# Altium footprint library 3.22-杂项.PcbLib: 985 footprints (part 43 of 64)
Each footprint in its own frame and in the unit in brackets; x right, y up, seen from the top. Pads: shape width x height; smd on the part's side, far side on the other; paste and mask are expansions set on the pad; w line width, h text height; cw(c..) or ccw(c..) is an arc to the next point about the centre after c.
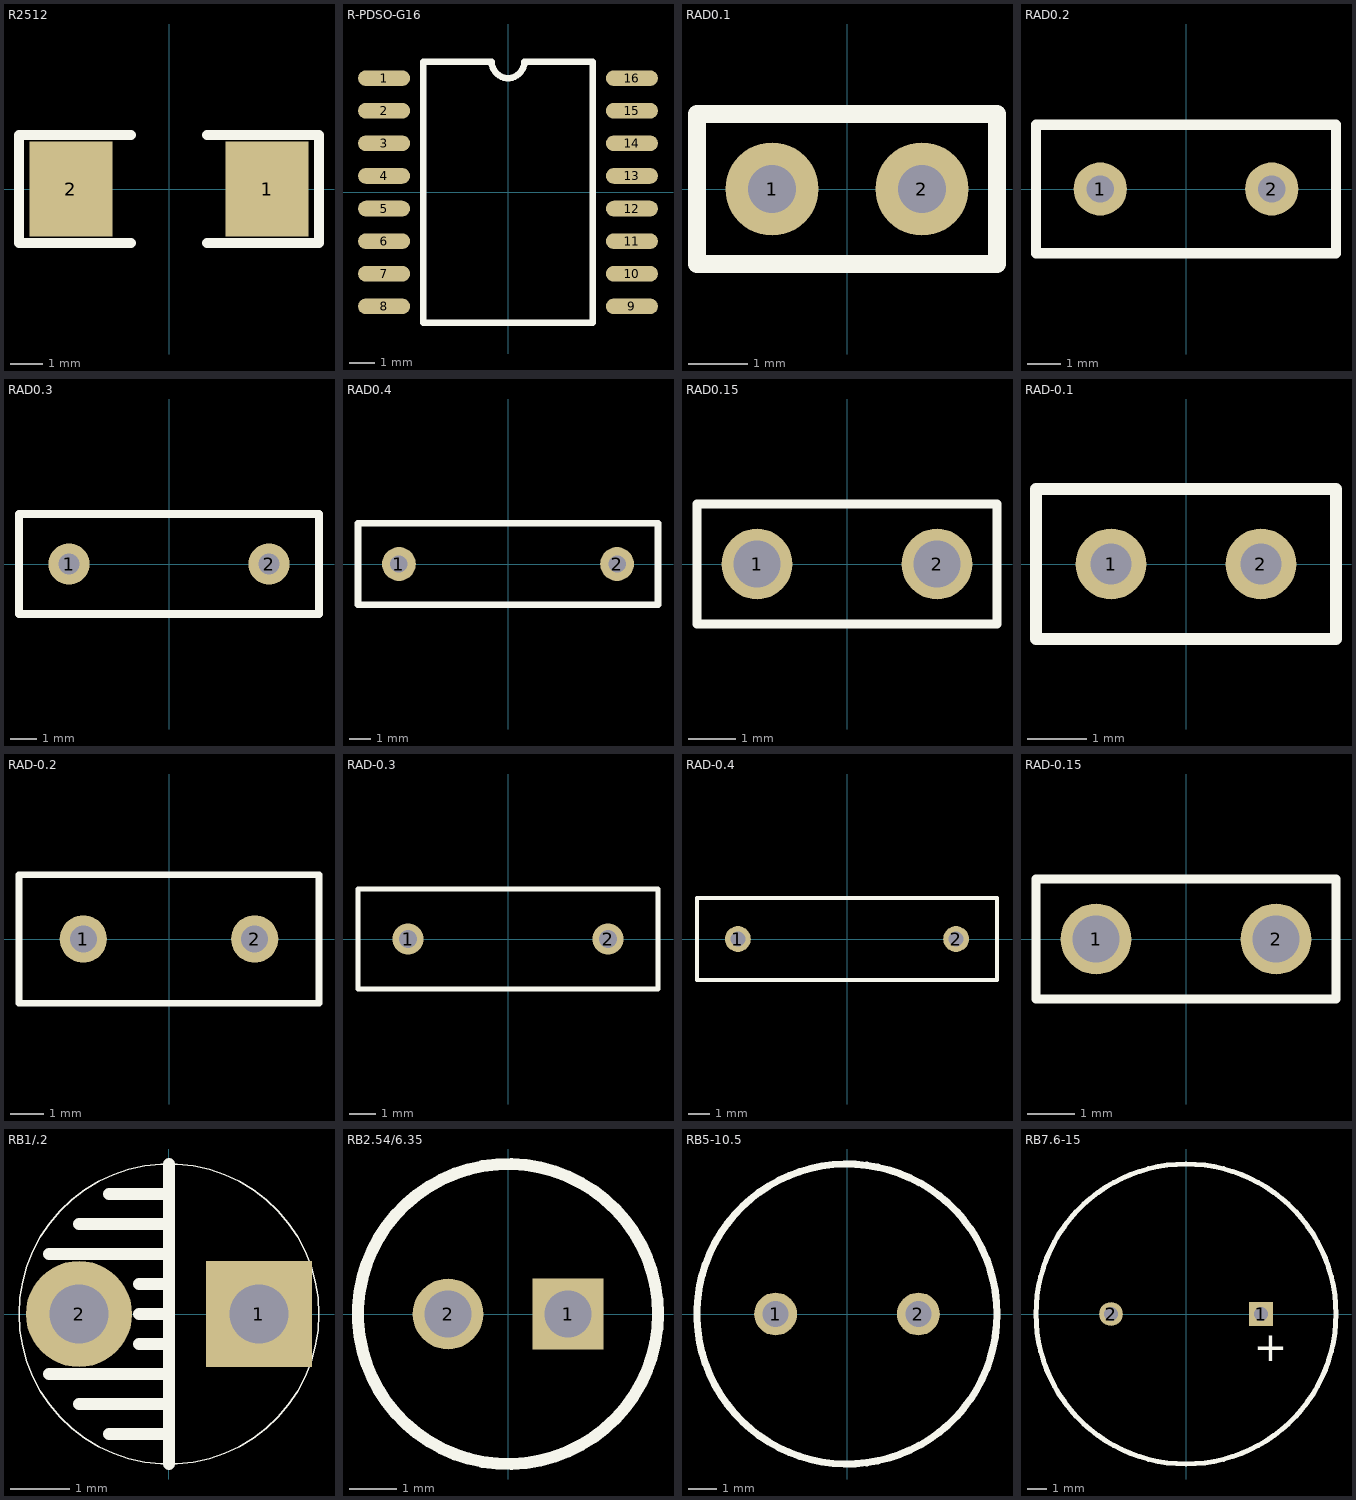
[diagram p42: the footprints below, top view; thin cyan lines are the x and y axes]

## R2512 [mil] "2512封装电阻、体积6.3*3.2*0.6, 0.33 1w"
pads (2):
  rect 100x115 smd: 1(118.11,0) 2(-118.11,0)
Top Overlay:
  lines w12: -45.67,-65 -180.67,-65 -180.67,65 -45.67,65 ; 45.67,-65 180.67,-65 180.67,65 45.67,65

## R-PDSO-G16 [mil]
pads (16):
  oval 80x24 smd: 1(-190,175) 2(-190,125) 3(-190,75) 4(-190,25) 5(-190,-25) 6(-190,-75) 7(-190,-125) 8(-190,-175) 9(190,-175) 10(190,-125) 11(190,-75) 12(190,-25) 13(190,25) 14(190,75) 15(190,125) 16(190,175)
Top Overlay:
  lines w10: -130,-200 -130,200 -25,200 ccw(c0,200) 25,200 130,200 130,-200 -130,-200

## RAD0.1 [mil]
pads (2):
  round 62 hole 32: 1(-50,0) 2(50,0)
Top Overlay:
  lines w12: -100,-50 100,-50 100,50 -100,50 -100,-50

## RAD0.2 [mil]
pads (2):
  round 62 hole 32: 1(-100,0) 2(100,0)
Top Overlay:
  lines w12: -175,-75 -175,75 175,75 175,-75 -175,-75

## RAD0.3 [mil]
pads (2):
  round 62 hole 32: 1(-150,0) 2(150,0)
Top Overlay:
  lines w12: -225,-75 -225,75 225,75 225,-75 -225,-75

## RAD0.4 [mil]
pads (2):
  round 62 hole 32: 1(-200,0) 2(200,0)
Top Overlay:
  lines w12: -275,-75 275,-75 275,75 -275,75 -275,-75

## RAD0.15 [mm] "Indicating Instrument; 2 Leads"
pads (2):
  round 1.5 hole 1: 1(-1.905,0) 2(1.905,0)
Top Overlay:
  lines w0.2: -3.175,-1.27 3.175,-1.27 3.175,1.27 -3.175,1.27 -3.175,-1.27

## RAD-0.1 [mm] "Indicating Instrument; 2 Leads"
pads (2):
  round 1.2 hole 0.7: 1(-1.27,0) 2(1.27,0)
Top Overlay:
  lines w0.2: -2.54,-1.27 -2.54,1.27 2.54,1.27 2.54,-1.27 -2.54,-1.27

## RAD-0.2 [mm]
pads (2):
  round 1.4 hole 0.8: 1(-2.54,0) 2(2.54,0)
Top Overlay:
  lines w0.2: -4.445,-1.905 -4.445,1.905 4.445,1.905 4.445,-1.905 -4.445,-1.905

## RAD-0.3 [mm] "Capacitor; 2 Leads"
height 6
pads (2):
  round 1.2 hole 0.7: 1(-3.81,0) 2(3.81,0)
Top Overlay:
  lines w0.2: -5.715,-1.905 5.715,-1.905 5.715,1.905 -5.715,1.905 -5.715,-1.905

## RAD-0.4 [mm] "Servo Motor; 2 Leads"
pads (2):
  round 1.2 hole 0.7: 1(-5.08,0) 2(5.08,0)
Top Overlay:
  lines w0.2: -6.985,-1.905 -6.985,1.905 6.985,1.905 6.985,-1.905 -6.985,-1.905

## RAD-0.15 [mm] "Indicating Instrument; 2 Leads"
pads (2):
  round 1.5 hole 1: 1(-1.905,0) 2(1.905,0)
Top Overlay:
  lines w0.2: -3.175,-1.27 -3.175,1.27 3.175,1.27 3.175,-1.27 -3.175,-1.27

## RB1/.2 [mm]
pads (2):
  rect 1.8x1.8 hole 1: 1(1.524,0)
  round 1.8 hole 1: 2(-1.524,0)
Top Overlay:
  circle w0.025: c0,0 r2.54
  lines w0.203: -2.032,-1.016 0,-1.016 ; -2.032,1.016 0,1.016 ; -1.524,-1.524 0,-1.524 ; -1.524,1.524 0,1.524 ; -1.016,-2.032 0,-2.032 ; -1.016,2.032 0,2.032 ; -0.508,-0.508 0,-0.508 ; -0.508,0 0,0 ; -0.508,0.508 0,0.508 ; 0,-2.54 0,2.54

## RB2.54/6.35 [mm] "光电二极客2CU2C,间距2.54mm，轮廓6.35，打点为正"
pads (2):
  rect 1.5x1.5 hole 1: 1(1.27,0)
  round 1.5 hole 1: 2(-1.27,0)
Top Overlay:
  circle w0.254: c0,0 r3.175

## RB5-10.5 [mm] "Motor, General Kind; 2 Leads"
pads (2):
  round 1.5 hole 0.9: 1(-2.5,0) 2(2.5,0)
Top Overlay:
  circle w0.25: c0,0 r5.25
Mechanical 1:
  circle w0.02: c0,0 r5.25

## RB7.6-15 [mm] "Polarized Capacitor (Radial); 2 Leads"
pads (2):
  rect 1.2x1.2 hole 0.7: 1(3.81,0)
  round 1.2 hole 0.7: 2(-3.81,0)
Top Overlay:
  circle w0.254: c0,0 r7.62
  text "+" at 3.433,-2.388 h1.5